# Altium footprint library SMT.PcbLib: 379 footprints (part 9 of 24)
Each footprint in its own frame and in the unit in brackets; x right, y up, seen from the top. Pads: shape width x height; smd on the part's side, far side on the other; paste and mask are expansions set on the pad; w line width, h text height; cw(c..) or ccw(c..) is an arc to the next point about the centre after c.
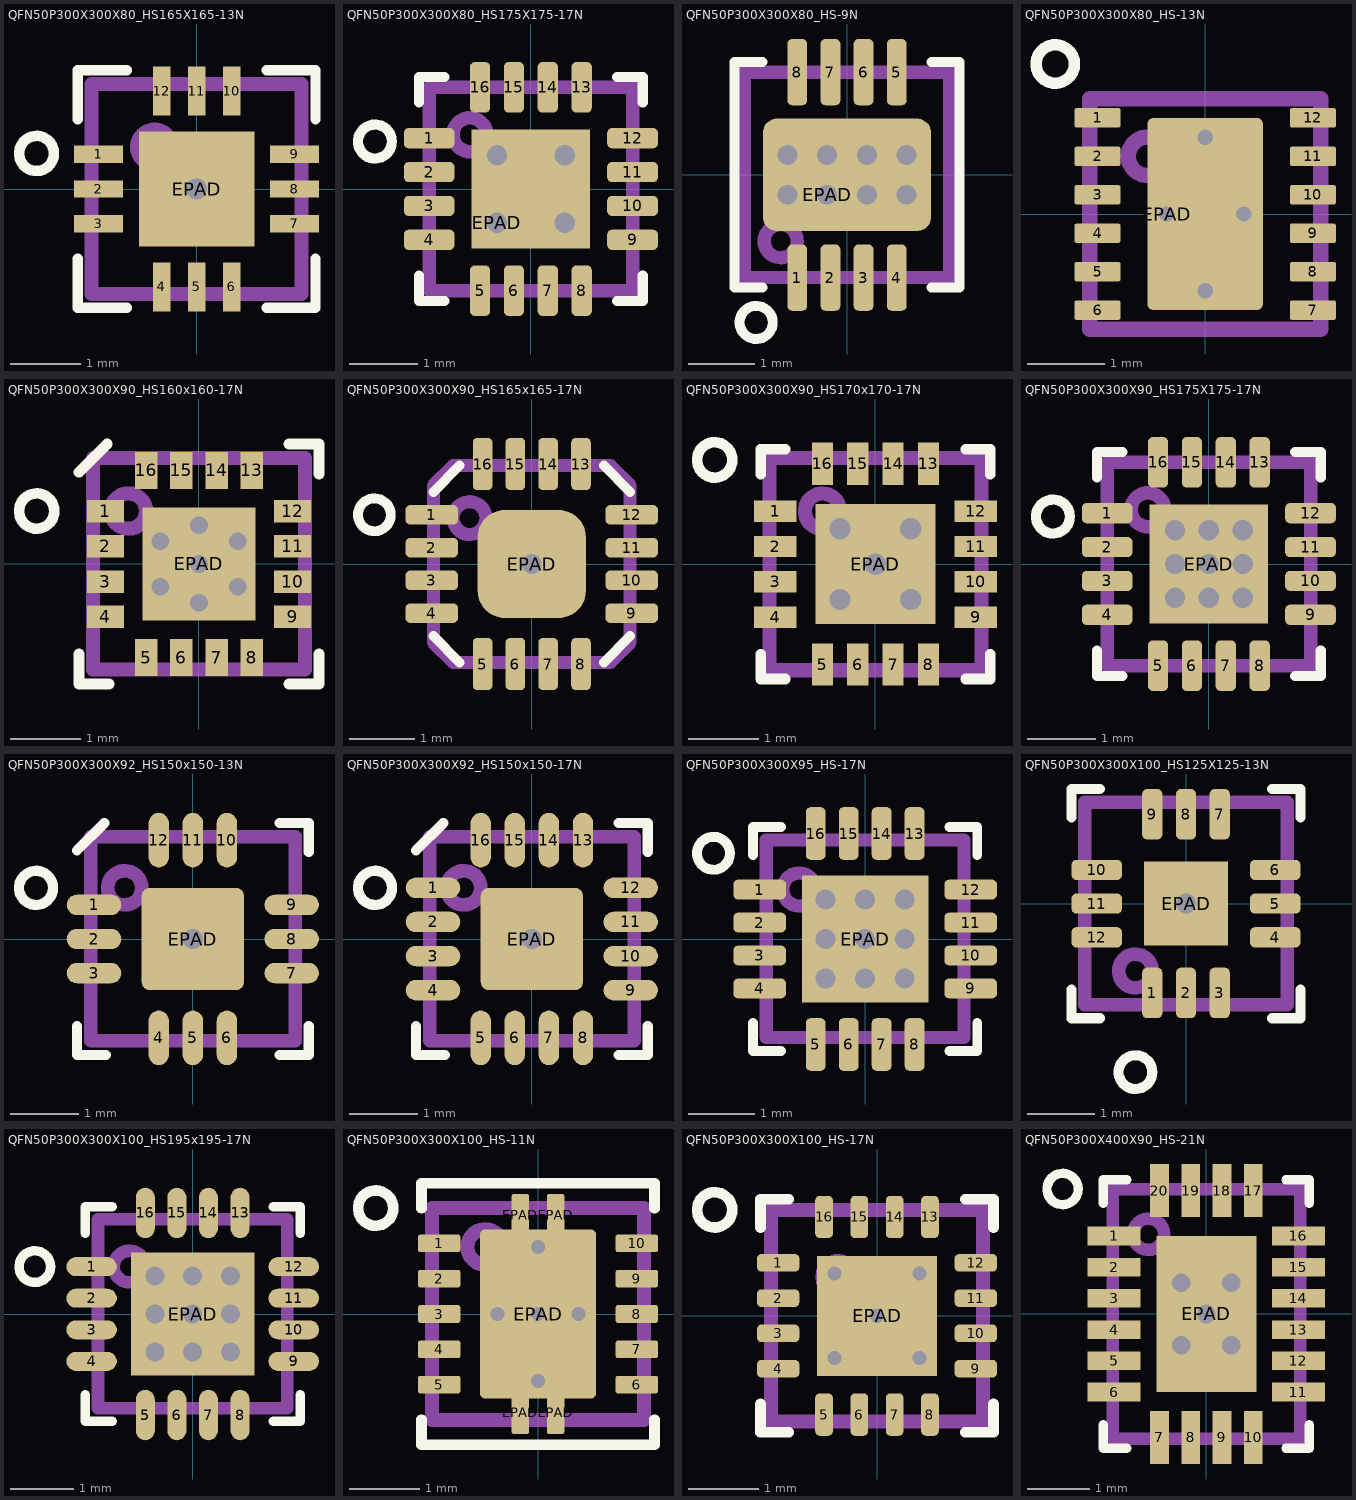
[diagram p8: the footprints below, top view; thin cyan lines are the x and y axes]

## QFN50P300X300X80_HS165X165-13N [mm] "QFN, 12-Leads, Body 3,0x3,0mm, Pitch 0,50mm, Thermal Pad 1,65x1,65mm, IPC Medium Density"
height 0.8
pads (13):
  rect 0.7x0.25 smd mask+0.03: 1(-1.4,0.5) 2(-1.4,0) 3(-1.4,-0.5) 7(1.4,-0.5) 8(1.4,0) 9(1.4,0.5)
  rect 0.25x0.7 smd mask+0.03: 4(-0.5,-1.4) 5(0,-1.4) 6(0.5,-1.4) 10(0.5,1.4) 11(0,1.4) 12(-0.5,1.4)
  rect 1.65x1.65 hole 0.3 mask+0.05: EPAD(0,0)
Top Overlay:
  circle w0.15: c-2.286,0.508 r0.25
  lines w0.15: -1.7,-1 -1.7,-1.7 -1,-1.7 ; -1.7,1 -1.7,1.7 -1,1.7 ; 1,-1.7 1.7,-1.7 1.7,-1 ; 1,1.7 1.7,1.7 1.7,1
Top Paste:
  region: -0.6,0.6 -0.6,-0.6 0.6,-0.6 0.6,0.6
Mechanical 1:
  circle w0.2: c-0.6,0.6 r0.25
  lines w0.2: -1.5,-1.5 -1.5,1.5 1.5,1.5 1.5,-1.5 -1.5,-1.5
3D body "QFN50P305X305X80_HS-13N.step": height 0.8, standoff 0, extent -1.6,-1.6 1.6,1.6

## QFN50P300X300X80_HS175X175-17N [mm] "QFN, 16-Leads, Body 3,00x3,00mm, Pitch 0,50mm, Thermal Pad 1,75x1,75mm, IPC Medium Density"
height 0.8
pads (17):
  rrect50% 0.75x0.3 smd paste-0.01 mask+0.04: 1(-1.5,0.75) 2(-1.5,0.25) 3(-1.5,-0.25) 4(-1.5,-0.75) 9(1.5,-0.75) 10(1.5,-0.25) 11(1.5,0.25) 12(1.5,0.75)
  rrect50% 0.3x0.75 smd paste-0.01 mask+0.04: 5(-0.75,-1.5) 6(-0.25,-1.5) 7(0.25,-1.5) 8(0.75,-1.5) 13(0.75,1.5) 14(0.25,1.5) 15(-0.25,1.5) 16(-0.75,1.5)
  rect 1.75x1.75 hole 0.3 copper offset 0.5,0.5 paste+0 mask+0.05: EPAD(-0.5,-0.5)
via -0.5,0.5 diameter 0.7 hole 0.3
via 0.5,-0.5 diameter 0.7 hole 0.3
via 0.5,0.5 diameter 0.7 hole 0.3
Top Overlay:
  circle w0.15: c-2.3,0.7 r0.25
  lines w0.15: -1.65,-1.275 -1.65,-1.65 -1.275,-1.65 ; -1.65,1.275 -1.65,1.65 -1.275,1.65 ; 1.275,-1.65 1.65,-1.65 1.65,-1.275 ; 1.275,1.65 1.65,1.65 1.65,1.275
Top Paste:
  rectangle: -0.725,-0.725 0.725,0.725
Mechanical 1:
  circle w0.2: c-0.9,0.8 r0.25
  lines w0.2: -1.5,-1.5 -1.5,1.5 1.5,1.5 1.5,-1.5 -1.5,-1.5
3D body "User Library-QFN-16_3x3.STEP": height 0.9, standoff 0, extent -1.5,-1.5 1.542,1.542

## QFN50P300X300X80_HS-9N [mm] "QFN, 8-Leads, Body 3,00x3,00mm, Pitch 0,50mm, Thermal Pad 2,54x1,70mm, IPC Medium Density"
height 0.8
pads (9):
  rrect50% 0.3x1 smd mask+0.04: 1(-0.75,-1.55) 2(-0.25,-1.55) 3(0.25,-1.55) 4(0.75,-1.55) 5(0.75,1.55) 6(0.25,1.55) 7(-0.25,1.55) 8(-0.75,1.55)
  rrect25% 2.54x1.7 hole 0.3 copper offset 0.3,0.3 mask+0.03: EPAD(-0.3,-0.3)
via -0.3,0.3 diameter 0.7 hole 0.3
via -0.9,0.3 diameter 0.7 hole 0.3
via -0.9,-0.3 diameter 0.7 hole 0.3
via 0.3,0.3 diameter 0.7 hole 0.3
via 0.3,-0.3 diameter 0.7 hole 0.3
via 0.9,0.3 diameter 0.7 hole 0.3
via 0.9,-0.3 diameter 0.7 hole 0.3
Top Overlay:
  circle w0.15: c-1.37,-2.226 r0.25
  lines w0.15: -1.275,-1.7 -1.7,-1.7 -1.7,1.7 -1.275,1.7 ; 1.275,-1.7 1.7,-1.7 1.7,1.7 1.275,1.7
Top Paste:
  rectangle: -0.75,-0.6 0.75,0.6
Mechanical 1:
  circle w0.2: c-1,-1 r0.25
  lines w0.2: -1.55,-1.55 1.55,-1.55 1.55,1.55 -1.55,1.55 -1.55,-1.55
3D body "QFN3X3.stp": height 0.81, standoff 0.01, extent -1.5,-1.515 1.5,1.525

## QFN50P300X300X80_HS-13N [mm] "QFN, 12-Leads, Body 3,00x3,00mm, Pitch 0,00mm/0,50mm, Thermal Pad 1,50x2,50mm, IPC Medium Density"
height 0.8
pads (13):
  rrect20% 0.6x0.25 smd paste+0 mask+0.05: 1(-1.4,1.25) 2(-1.4,0.75) 3(-1.4,0.25) 4(-1.4,-0.25) 5(-1.4,-0.75) 6(-1.4,-1.25) 7(1.4,-1.25) 8(1.4,-0.75) 9(1.4,-0.25) 10(1.4,0.25) 11(1.4,0.75) 12(1.4,1.25)
  rrect10% 1.5x2.5 hole 0.2 copper offset 0.5,0: EPAD(-0.5,0)
via 0,1 diameter 0.5 hole 0.2
via 0,-1 diameter 0.5 hole 0.2
via 0.5,0 diameter 0.5 hole 0.2
Top Overlay:
  circle w0.15: c-1.95,1.95 r0.25
Top Paste:
  rectangle: -0.69,0.105 0.69,1.215
  rectangle: -0.69,-1.215 0.69,-0.105
Mechanical 1:
  circle w0.2: c-0.75,0.75 r0.25
  lines w0.2: -1.5,-1.5 -1.5,1.5 1.5,1.5 1.5,-1.5 -1.5,-1.5
3D body "QFN50P300X300X80_HS-13N.step": height 0.8, standoff 0, extent -1.501,-1.5 1.501,1.5

## QFN50P300X300X90_HS160x160-17N [mm] "QFN, 16-Leads, Body 3,00x3,00mm, Pitch 0,50mm, Thermal Pad 1,6x1,6mm, IPC Medium Density"
height 0.9
pads (17):
  rect 0.52x0.32 smd mask+0.03: 1(-1.325,0.75) 2(-1.325,0.25) 3(-1.325,-0.25) 4(-1.325,-0.75) 9(1.325,-0.75) 10(1.325,-0.25) 11(1.325,0.25) 12(1.325,0.75)
  rect 0.32x0.52 smd mask+0.03: 5(-0.75,-1.325) 6(-0.25,-1.325) 7(0.25,-1.325) 8(0.75,-1.325) 13(0.75,1.325) 14(0.25,1.325) 15(-0.25,1.325) 16(-0.75,1.325)
  rect 1.6x1.6 hole 0.25 mask+0.05: EPAD(0,0)
via 0.55,0.32 diameter 0.5 hole 0.25
via -0.55,-0.32 diameter 0.5 hole 0.25
via 0.55,-0.32 diameter 0.5 hole 0.25
via 0,0.55 diameter 0.5 hole 0.25
via 0,-0.55 diameter 0.5 hole 0.25
via -0.55,0.32 diameter 0.5 hole 0.25
Top Overlay:
  circle w0.15: c-2.3,0.75 r0.25
  lines w0.15: -1.7,-1.275 -1.7,-1.7 -1.275,-1.7 ; -1.7,1.3 -1.3,1.7 ; 1.275,-1.7 1.7,-1.7 1.7,-1.275 ; 1.275,1.7 1.7,1.7 1.7,1.275
Top Paste:
  region: -0.7,0.7 -0.7,-0.7 0.7,-0.7 0.7,0.7
Mechanical 1:
  circle w0.2: c-1,0.75 r0.25
  lines w0.2: -1.5,-1.494 -1.5,1.5 1.5,1.5 1.5,-1.494 -1.5,-1.494
Mechanical 20:
  text "Использовать min 1 oz меди для верхнего и нижнего слоев. См. datasheet" at -1.75,1.95 h1.2
3D body "QFN50P300x300.stp": height 0.91, standoff -0.04, extent -1.535,-1.535 1.535,1.535

## QFN50P300X300X90_HS165x165-17N [mm] "QFN, 16-Leads, Body 3,00x3,00mm, Pitch 0,50mm, Thermal Pad 1,65x1,65mm, IPC Medium Density"
height 0.9
pads (17):
  rrect50% 0.8x0.3 smd mask+0.03: 1(-1.525,0.75) 2(-1.525,0.25) 3(-1.525,-0.25) 4(-1.525,-0.75) 9(1.525,-0.75) 10(1.525,-0.25) 11(1.525,0.25) 12(1.525,0.75)
  rrect50% 0.3x0.8 smd mask+0.03: 5(-0.75,-1.525) 6(-0.25,-1.525) 7(0.25,-1.525) 8(0.75,-1.525) 13(0.75,1.525) 14(0.25,1.525) 15(-0.25,1.525) 16(-0.75,1.525)
  rrect50% 1.65x1.65 hole 0.3: EPAD(0,0)
Top Overlay:
  circle w0.15: c-2.4,0.75 r0.25
  lines w0.15: -1.5,-1.1 -1.1,-1.5 ; -1.5,1.1 -1.1,1.5 ; 1.1,-1.5 1.5,-1.1 ; 1.1,1.5 1.5,1.1
Top Paste:
  region: -0.6,0.6 -0.6,-0.6 0.6,-0.6 0.6,0.6
Mechanical 1:
  circle w0.2: c-0.95,0.7 r0.25
  lines w0.2: -1.5,-1.2 -1.2,-1.5 1.2,-1.5 1.5,-1.2 1.5,1.2 1.2,1.5 -1.2,1.5 -1.5,1.2 -1.5,-1.2
Mechanical 15:
  lines w0.2: -0.5,0 0.5,0 ; 0,-0.5 0,0.5
3D body "User Library-QFN-16_3x3.STEP": height 0.9, standoff 0, extent -1.521,-1.5 1.521,1.542

## QFN50P300X300X90_HS170x170-17N [mm] "QFN, 16-Leads, Body 3,00x3,00mm, Pitch 0,50mm, Thermal Pad 1,70x1,70mm, IPC Medium Density"
height 0.9
pads (17):
  rect 0.6x0.3 smd mask+0.05: 1(-1.42,0.75) 2(-1.42,0.25) 3(-1.42,-0.25) 4(-1.42,-0.75) 9(1.42,-0.75) 10(1.42,-0.25) 11(1.42,0.25) 12(1.42,0.75)
  rect 0.3x0.6 smd mask+0.05: 5(-0.75,-1.42) 6(-0.25,-1.42) 7(0.25,-1.42) 8(0.75,-1.42) 13(0.75,1.42) 14(0.25,1.42) 15(-0.25,1.42) 16(-0.75,1.42)
  rect 1.7x1.7 hole 0.3 mask+0.05: EPAD(0,0)
via 0.5,0.5 diameter 0.6 hole 0.3
via 0.5,-0.5 diameter 0.6 hole 0.3
via -0.5,-0.5 diameter 0.6 hole 0.3
via -0.5,0.5 diameter 0.6 hole 0.3
Top Overlay:
  circle w0.15: c-2.275,1.475 r0.25
  lines w0.15: -1.625,-1.275 -1.625,-1.625 -1.275,-1.625 ; -1.625,1.275 -1.625,1.625 -1.275,1.625 ; 1.275,-1.625 1.625,-1.625 1.625,-1.275 ; 1.275,1.625 1.625,1.625 1.625,1.275
Top Paste:
  rectangle: -0.7,-0.7 0.7,0.7
Mechanical 1:
  circle w0.2: c-0.75,0.75 r0.25
  lines w0.2: -1.5,-1.5 -1.5,1.5 1.5,1.5 1.5,-1.5 -1.5,-1.5
3D body "QFN50P300X300X90_HS-17N.step": height 0.9, standoff 0, extent -1.501,-1.501 1.501,1.501

## QFN50P300X300X90_HS175X175-17N [mm] "QFN, 16-Leads, Body 3,00x3,00mm, Pitch 0,50mm, Thermal Pad 1,75x1,75mm, IPC Medium Density"
height 0.9
pads (17):
  rrect50% 0.75x0.3 smd paste-0.01 mask+0.03: 1(-1.5,0.75) 2(-1.5,0.25) 3(-1.5,-0.25) 4(-1.5,-0.75) 9(1.5,-0.75) 10(1.5,-0.25) 11(1.5,0.25) 12(1.5,0.75)
  rrect50% 0.3x0.75 smd paste-0.01 mask+0.03: 5(-0.75,-1.5) 6(-0.25,-1.5) 7(0.25,-1.5) 8(0.75,-1.5) 13(0.75,1.5) 14(0.25,1.5) 15(-0.25,1.5) 16(-0.75,1.5)
  rect 1.75x1.75 hole 0.3 paste+0 mask+0.05: EPAD(0,0)
via 0,-0.5 diameter 0.7 hole 0.3
via 0,0.5 diameter 0.7 hole 0.3
via 0.5,0 diameter 0.7 hole 0.3
via -0.5,0 diameter 0.7 hole 0.3
via 0.5,-0.5 diameter 0.7 hole 0.3
via -0.5,-0.5 diameter 0.7 hole 0.3
via 0.5,0.5 diameter 0.7 hole 0.3
via -0.5,0.5 diameter 0.7 hole 0.3
Top Overlay:
  circle w0.15: c-2.3,0.7 r0.25
  lines w0.15: -1.65,-1.275 -1.65,-1.65 -1.275,-1.65 ; -1.65,1.275 -1.65,1.65 -1.275,1.65 ; 1.275,-1.65 1.65,-1.65 1.65,-1.275 ; 1.275,1.65 1.65,1.65 1.65,1.275
Top Paste:
  rectangle: -0.725,-0.725 0.725,0.725
Mechanical 1:
  circle w0.2: c-0.9,0.8 r0.25
  lines w0.2: -1.5,-1.5 -1.5,1.5 1.5,1.5 1.5,-1.5 -1.5,-1.5
3D body "User Library-QFN-16_3x3.STEP": height 0.9, standoff 0, extent -1.5,-1.5 1.542,1.542

## QFN50P300X300X92_HS150x150-13N [mm] "QFN, 12-Leads, Body 3,00x3,00mm, Pitch 0,50mm, Thermal Pad 1,5x1,5mm, IPC Medium Density"
height 0.92
pads (13):
  oval 0.8x0.3 smd mask+0.03: 1(-1.45,0.5) 2(-1.45,0) 3(-1.45,-0.5) 7(1.45,-0.5) 8(1.45,0) 9(1.45,0.5)
  oval 0.3x0.8 smd mask+0.03: 4(-0.5,-1.45) 5(0,-1.45) 6(0.5,-1.45) 10(0.5,1.45) 11(0,1.45) 12(-0.5,1.45)
  rrect15% 1.5x1.5 hole 0.3: EPAD(0,0)
Top Overlay:
  circle w0.15: c-2.3,0.75 r0.25
  lines w0.15: -1.7,-1.275 -1.7,-1.7 -1.275,-1.7 ; -1.7,1.3 -1.3,1.7 ; 1.275,-1.7 1.7,-1.7 1.7,-1.275 ; 1.275,1.7 1.7,1.7 1.7,1.275
Top Paste:
  region: -0.7,0.7 -0.7,-0.7 0.7,-0.7 0.7,0.7
Mechanical 1:
  circle w0.2: c-1,0.75 r0.25
  lines w0.2: -1.5,-1.494 -1.5,1.5 1.5,1.5 1.5,-1.494 -1.5,-1.494
3D body "QFN50P300X300X92_HS150x150-13N.STEP": height 0.95, standoff 0, extent -1.5,-1.5 1.5,1.5

## QFN50P300X300X92_HS150x150-17N [mm] "QFN, 16-Leads, Body 3,00x3,00mm, Pitch 0,50mm, Thermal Pad 1,5x1,5mm, IPC Medium Density"
height 0.92
pads (17):
  oval 0.8x0.3 smd mask+0.03: 1(-1.45,0.75) 2(-1.45,0.25) 3(-1.45,-0.25) 4(-1.45,-0.75) 9(1.45,-0.75) 10(1.45,-0.25) 11(1.45,0.25) 12(1.45,0.75)
  oval 0.3x0.8 smd mask+0.03: 5(-0.75,-1.45) 6(-0.25,-1.45) 7(0.25,-1.45) 8(0.75,-1.45) 13(0.75,1.45) 14(0.25,1.45) 15(-0.25,1.45) 16(-0.75,1.45)
  rrect15% 1.5x1.5 hole 0.3: EPAD(0,0)
Top Overlay:
  circle w0.15: c-2.3,0.75 r0.25
  lines w0.15: -1.7,-1.275 -1.7,-1.7 -1.275,-1.7 ; -1.7,1.3 -1.3,1.7 ; 1.275,-1.7 1.7,-1.7 1.7,-1.275 ; 1.275,1.7 1.7,1.7 1.7,1.275
Top Paste:
  region: -0.7,0.7 -0.7,-0.7 0.7,-0.7 0.7,0.7
Mechanical 1:
  circle w0.2: c-1,0.75 r0.25
  lines w0.2: -1.5,-1.494 -1.5,1.5 1.5,1.5 1.5,-1.494 -1.5,-1.494
3D body "QFN50P300X300X92_HS150x150-17N.STEP": height 0.95, standoff 0, extent -1.5,-1.5 1.5,1.5

## QFN50P300X300X95_HS-17N [mm] "QFN, 16-Leads, Body 3,00x3,00mm, Pitch 0,50mm, Thermal Pad 1,70x1,70mm, IPC Medium Density"
height 0.95
pads (17):
  rrect50% 0.8x0.3 smd mask+0.03: 1(-1.6,0.75) 2(-1.6,0.25) 3(-1.6,-0.25) 4(-1.6,-0.75) 9(1.6,-0.75) 10(1.6,-0.25) 11(1.6,0.25) 12(1.6,0.75)
  rrect50% 0.3x0.8 smd mask+0.03: 5(-0.75,-1.6) 6(-0.25,-1.6) 7(0.25,-1.6) 8(0.75,-1.6) 13(0.75,1.6) 14(0.25,1.6) 15(-0.25,1.6) 16(-0.75,1.6)
  rect 1.92x1.92 hole 0.3 mask+0.05: EPAD(0,0)
via 0,0.6 diameter 0.7 hole 0.3
via 0,-0.6 diameter 0.7 hole 0.3
via 0.6,0 diameter 0.7 hole 0.3
via 0.6,0.6 diameter 0.7 hole 0.3
via -0.6,0.6 diameter 0.7 hole 0.3
via -0.6,0 diameter 0.7 hole 0.3
via -0.6,-0.6 diameter 0.7 hole 0.3
via 0.6,-0.6 diameter 0.7 hole 0.3
Top Overlay:
  circle w0.15: c-2.3,1.3 r0.25
  lines w0.15: -1.7,-1.275 -1.7,-1.7 -1.275,-1.7 ; -1.7,1.275 -1.7,1.7 -1.275,1.7 ; 1.275,-1.7 1.7,-1.7 1.7,-1.275 ; 1.275,1.7 1.7,1.7 1.7,1.275
Top Paste:
  region: -0.8,0.8 -0.8,-0.8 0.8,-0.8 0.8,0.8
Mechanical 1:
  circle w0.2: c-1,0.75 r0.25
  lines w0.2: -1.5,-1.494 -1.5,1.5 1.5,1.5 1.5,-1.494 -1.5,-1.494
3D body "QFN50P300X300X95_HS-17N.step": height 0.95, standoff 0, extent -1.52,-1.52 1.52,1.52

## QFN50P300X300X100_HS125X125-13N [mm] "QFN, 12-Leads, Body 3,00x3,00mm, Pitch 0,50mm, Thermal Pad 1,2x1,2mm, IPC Medium Density"
height 1
pads (13):
  rrect50% 0.3x0.75 smd mask+0.03: 1(-0.5,-1.325) 2(0,-1.325) 3(0.5,-1.325) 7(0.5,1.325) 8(0,1.325) 9(-0.5,1.325)
  rrect50% 0.75x0.3 smd mask+0.03: 4(1.325,-0.5) 5(1.325,0) 6(1.325,0.5) 10(-1.325,0.5) 11(-1.325,0) 12(-1.325,-0.5)
  rect 1.25x1.25 hole 0.3: EPAD(0,0)
Top Overlay:
  circle w0.15: c-0.75,-2.5 r0.25
  lines w0.15: -1.7,-1.275 -1.7,-1.7 -1.275,-1.7 ; -1.7,1.275 -1.7,1.7 -1.275,1.7 ; 1.275,-1.7 1.7,-1.7 1.7,-1.275 ; 1.275,1.7 1.7,1.7 1.7,1.275
Top Paste:
  region: -0.6,-0.6 0.6,-0.6 0.6,0.6 -0.6,0.6
Mechanical 1:
  circle w0.2: c-0.75,-1 r0.25
  lines w0.2: 1.5,-1.5 1.5,1.5 -1.5,1.5 -1.5,-1.5 1.5,-1.5 ; 1.5,-1.5 1.5,-1.5
3D body "QFN16-3X3.STEP": height 0.91, standoff 0.01, extent -1.5,-1.5 1.5,1.5

## QFN50P300X300X100_HS195x195-17N [mm] "QFN, 16-Leads, Body 3,00x3,00mm, Pitch 0,50mm, Thermal Pad 1,95x1,95mm, IPC Medium Density"
height 1
pads (17):
  oval 0.8x0.3 smd mask+0.03: 1(-1.6,0.75) 2(-1.6,0.25) 3(-1.6,-0.25) 4(-1.6,-0.75) 9(1.6,-0.75) 10(1.6,-0.25) 11(1.6,0.25) 12(1.6,0.75)
  oval 0.3x0.8 smd mask+0.03: 5(-0.75,-1.6) 6(-0.25,-1.6) 7(0.25,-1.6) 8(0.75,-1.6) 13(0.75,1.6) 14(0.25,1.6) 15(-0.25,1.6) 16(-0.75,1.6)
  rect 1.95x1.95 hole 0.3 mask+0.05: EPAD(0,0)
via 0.6,-0.6 diameter 0.7 hole 0.3
via -0.6,-0.6 diameter 0.7 hole 0.3
via -0.6,0 diameter 0.7 hole 0.3
via -0.6,0.6 diameter 0.7 hole 0.3
via 0.6,0.6 diameter 0.7 hole 0.3
via 0.6,0 diameter 0.7 hole 0.3
via 0,-0.6 diameter 0.7 hole 0.3
via 0,0.6 diameter 0.7 hole 0.3
Top Overlay:
  circle w0.15: c-2.5,0.75 r0.25
  lines w0.15: -1.7,-1.275 -1.7,-1.7 -1.275,-1.7 ; -1.7,1.275 -1.7,1.7 -1.275,1.7 ; 1.275,-1.7 1.7,-1.7 1.7,-1.275 ; 1.275,1.7 1.7,1.7 1.7,1.275
Top Paste:
  region: -0.8,0.8 -0.8,-0.8 0.8,-0.8 0.8,0.8
Mechanical 1:
  circle w0.2: c-1,0.75 r0.25
  lines w0.2: -1.5,-1.494 1.5,-1.494 1.5,1.5 -1.5,1.5 -1.5,-1.494
3D body "QFN16-3X3.STEP": height 0.92, standoff 0.02, extent -1.5,-1.5 1.5,1.5

## QFN50P300X300X100_HS-11N [mm] "QFN, 10-Leads, Body 3,00x3,00mm, Pitch 0,50mm, Thermal Pad 1,65x2,40mm, IPC Medium Density"
height 1
pads (15):
  rrect25% 0.6x0.25 smd paste+0 mask+0.07: 1(-1.4,1) 2(-1.4,0.5) 3(-1.4,0) 4(-1.4,-0.5) 5(-1.4,-1) 6(1.4,-1) 7(1.4,-0.5) 8(1.4,0) 9(1.4,0.5) 10(1.4,1)
  rrect25% 0.25x0.6 smd paste-10 mask+0.07: EPAD(-0.25,1.4) EPAD(-0.25,-1.4) EPAD(0.25,1.4) EPAD(0.25,-1.4)
  rrect10% 1.65x2.4 hole 0.2 paste-10 mask+0.07: EPAD(0,0)
via 0,-0.95 diameter 0.5 hole 0.2
via 0,0.95 diameter 0.5 hole 0.2
via -0.575,0 diameter 0.5 hole 0.2
via 0.575,0 diameter 0.5 hole 0.2
Top Overlay:
  circle w0.15: c-2.3,1.5 r0.25
  lines w0.15: -1.65,-1.5 -1.65,-1.85 1.65,-1.85 1.65,-1.5 ; -1.65,1.5 -1.65,1.85 1.65,1.85 1.65,1.5
Top Paste:
  rectangle: -0.75,-1.16 0.75,-0.1
  rectangle: -0.75,0.1 0.75,1.16
  region: -0.375,-1.671 -0.375,-1.388 -0.375,-1.383 -0.371,-1.372 -0.363,-1.364 -0.353,-1.36 -0.347,-1.36 -0.153,-1.36 -0.147,-1.36 -0.137,-1.364 -0.129,-1.372 -0.125,-1.383 -0.125,-1.388 -0.125,-1.668 -0.125,-1.675 -0.13,-1.686 -0.139,-1.695 -0.151,-1.7 -0.157,-1.7 -0.343,-1.7 -0.349,-1.7 -0.36,-1.696 -0.369,-1.688 -0.374,-1.677
  region: 0.375,-1.671 0.375,-1.388 0.375,-1.383 0.371,-1.372 0.363,-1.365 0.352,-1.36 0.347,-1.36 0.153,-1.36 0.147,-1.36 0.137,-1.364 0.129,-1.372 0.125,-1.383 0.125,-1.388 0.125,-1.668 0.125,-1.675 0.13,-1.686 0.139,-1.695 0.151,-1.7 0.157,-1.7 0.343,-1.7 0.349,-1.7 0.36,-1.696 0.369,-1.688 0.374,-1.677
  region: 0.375,1.671 0.375,1.388 0.375,1.383 0.371,1.372 0.363,1.364 0.352,1.36 0.347,1.36 0.153,1.36 0.147,1.36 0.137,1.364 0.129,1.372 0.125,1.383 0.125,1.388 0.125,1.668 0.125,1.674 0.13,1.686 0.139,1.695 0.151,1.7 0.157,1.7 0.343,1.7 0.349,1.7 0.36,1.696 0.369,1.688 0.374,1.677
  region: -0.375,1.671 -0.375,1.388 -0.375,1.382 -0.371,1.372 -0.363,1.364 -0.353,1.36 -0.347,1.36 -0.153,1.36 -0.147,1.36 -0.137,1.364 -0.129,1.372 -0.125,1.382 -0.125,1.388 -0.125,1.668 -0.125,1.674 -0.13,1.686 -0.139,1.695 -0.151,1.7 -0.157,1.7 -0.343,1.7 -0.349,1.7 -0.36,1.696 -0.369,1.688 -0.374,1.677
Mechanical 1:
  circle w0.2: c-0.75,0.95 r0.25
  lines w0.2: -1.5,-1.5 -1.5,1.5 1.5,1.5 1.5,-1.5 -1.5,-1.5
3D body "QFN50P300X300X100_HS-11N.step": height 1, standoff 0, extent -1.501,-1.5 1.501,1.5

## QFN50P300X300X100_HS-17N [mm] "QFN, 16-Leads, Body 3,00x3,00mm, Pitch 0,50mm, Thermal Pad 1,70x1,70mm, IPC Medium Density"
height 1
pads (17):
  rrect50% 0.6x0.25 smd paste+0 mask+0.06: 1(-1.4,0.75) 2(-1.4,0.25) 3(-1.4,-0.25) 4(-1.4,-0.75) 9(1.4,-0.75) 10(1.4,-0.25) 11(1.4,0.25) 12(1.4,0.75)
  rrect50% 0.25x0.6 smd paste+0 mask+0.06: 5(-0.75,-1.4) 6(-0.25,-1.4) 7(0.25,-1.4) 8(0.75,-1.4) 13(0.75,1.4) 14(0.25,1.4) 15(-0.25,1.4) 16(-0.75,1.4)
  rect 1.7x1.7 hole 0.2 paste-20 mask+0.05: EPAD(0,0)
via 0.6,0.6 diameter 0.45 hole 0.2
via 0.6,-0.6 diameter 0.45 hole 0.2
via -0.6,-0.6 diameter 0.45 hole 0.2
via -0.6,0.6 diameter 0.45 hole 0.2
Top Overlay:
  circle w0.15: c-2.3,1.5 r0.25
  lines w0.15: -1.65,-1.25 -1.65,-1.65 -1.25,-1.65 ; -1.65,1.25 -1.65,1.65 -1.25,1.65 ; 1.25,-1.65 1.65,-1.65 1.65,-1.25 ; 1.25,1.65 1.65,1.65 1.65,1.25
Top Paste:
  rectangle: -0.775,-0.775 0.775,0.775
Mechanical 1:
  circle w0.15: c-0.55,0.55 r0.25
  lines w0.2: -1.5,-1.5 1.5,-1.5 1.5,1.5 -1.5,1.5 -1.5,-1.5
3D body "QFN50P300X300X100_HS-17N.step": height 1, standoff 0, extent -1.501,-1.501 1.501,1.501

## QFN50P300X400X90_HS-21N [mm] "QFN, 20-Leads, Body 3,00x4,00mm, Pitch 0,50mm, Thermal Pad 1,60x2,50mm, IPC Medium Density"
height 0.9
pads (21):
  rect 0.85x0.3 smd paste+0 mask+0.04: 1(-1.475,1.25) 2(-1.475,0.75) 3(-1.475,0.25) 4(-1.475,-0.25) 5(-1.475,-0.75) 6(-1.475,-1.25) 11(1.475,-1.25) 12(1.475,-0.75) 13(1.475,-0.25) 14(1.475,0.25) 15(1.475,0.75) 16(1.475,1.25)
  rect 0.3x0.85 smd paste+0 mask+0.04: 7(-0.75,-1.975) 8(-0.25,-1.975) 9(0.25,-1.975) 10(0.75,-1.975) 17(0.75,1.975) 18(0.25,1.975) 19(-0.25,1.975) 20(-0.75,1.975)
  rect 1.6x2.5 hole 0.3: EPAD(0,0)
via 0.4,0.5 diameter 0.7 hole 0.3
via -0.4,0.5 diameter 0.7 hole 0.3
via -0.4,-0.5 diameter 0.7 hole 0.3
via 0.4,-0.5 diameter 0.7 hole 0.3
Top Overlay:
  circle w0.15: c-2.3,2 r0.25
  lines w0.15: -1.65,-1.775 -1.65,-2.15 -1.275,-2.15 ; -1.65,1.775 -1.65,2.15 -1.275,2.15 ; 1.275,-2.15 1.65,-2.15 1.65,-1.775 ; 1.275,2.15 1.65,2.15 1.65,1.775
Top Paste:
  rectangle: -0.6,-1 0.6,1
Mechanical 1:
  circle w0.2: c-0.925,1.275 r0.25
  lines w0.2: -1.5,-2 -1.5,2 1.5,2 1.5,-2 -1.5,-2
3D body "QFN50P300X400X90_HS-21N.step": height 0.9, standoff 0, extent -1.501,-2.001 1.501,2.001